# Altium footprint library ESP8266.PcbLib: 17 footprints (part 2 of 2)
Each footprint in its own frame and in the unit in brackets; x right, y up, seen from the top. Pads: shape width x height; smd on the part's side, far side on the other; paste and mask are expansions set on the pad; w line width, h text height; cw(c..) or ccw(c..) is an arc to the next point about the centre after c.
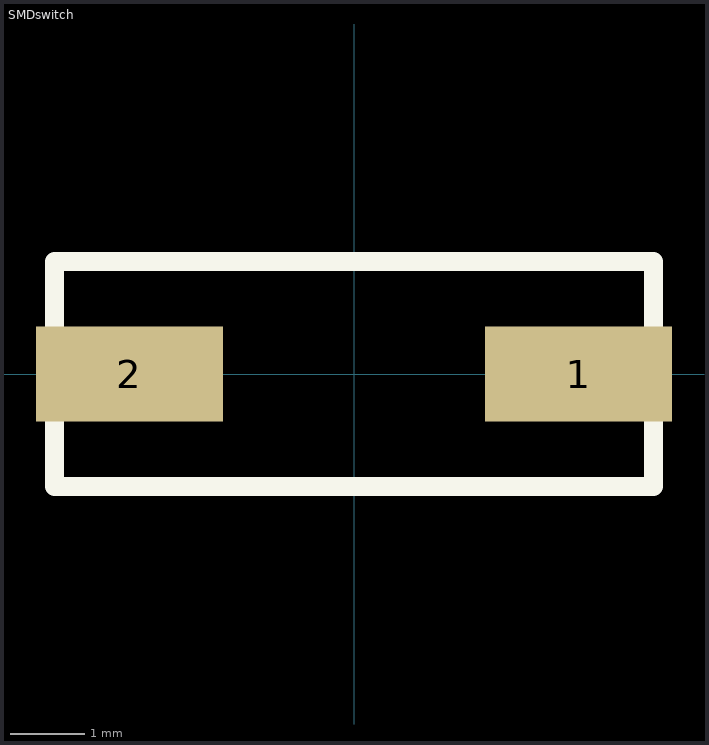
[diagram p1: the footprint, top view; thin cyan lines are the x and y axes]

## SMDswitch [mm]
pads (2):
  rect 2.5x1.27 smd: 1(3,0) 2(-3,0)
Top Overlay:
  lines w0.254: -4,-1.5 -4,1.5 4,1.5 4,-1.5 -4,-1.5